# Altium footprint library PCB_CONNECTORS.PcbLib: 676 footprints (part 43 of 43) (continued)
## WEIDMULLER_1234600000 [mm] "Terminal Block, 24A 600V, Pitch 5.08mm, 8 Positions, Screw Connection" (continued)
  text "8" at 17.453,-3.2 h1
  text "7" at 12.373,-3.2 h1
  text "6" at 7.293,-3.2 h1
  text "5" at 2.213,-3.2 h1
  text "4" at -2.867,-3.2 h1
  text "3" at -7.947,-3.2 h1
  text "2" at -13.027,-3.2 h1
  text "1" at -18.032,-3.2 h1
3D body "WEIDMULLER_1234600000.stp": height 10, standoff -3.5, extent -20.995,-3.775 20.595,4.225

## WEIDMULLER_1760490000 [mm] "Terminal Block, 24A 600V, Pitch 5.08mm, 2 Positions, Screw Connection"
height 10
pads (2):
  round 2 hole 1.3: 1(-2.54,0) 2(2.54,0)
Top Overlay:
  circle w0.2: c2.54,0.577 r2
  circle w0.2: c-2.54,0.577 r2
  lines w0.2: -5.08,-3.25 -3.525,-3.25 ; -5.08,-2.25 -3.525,-2.25 ; -5.08,2.75 5.08,2.75 ; -5.08,2.95 -5.18,2.95 -5.38,2.75 -5.58,2.75 -5.58,3.75 -5.38,3.75 -5.18,3.55 -5.08,3.55 ; -4.19,1.52 -3.593,0.923 ; -3.483,2.227 -2.651,1.396 ; -1.617,-1.053 -1.597,-1.073 ; -1.35,-3.25 1.375,-3.25 ; -1.35,-2.25 1.375,-2.25 ; -1.144,-0.111 -0.89,-0.366 ; 0.89,1.52 1.487,0.923 ; 1.597,2.227 2.429,1.396 ; 3.463,-1.053 3.483,-1.073 ; 3.525,-3.25 5.08,-3.25 ; 3.525,-2.25 5.08,-2.25 ; 3.936,-0.111 4.19,-0.366 ; 5.08,-1.55 5.13,-1.55 5.33,-1.75 5.53,-1.75 5.53,-0.75 5.33,-0.75 5.13,-0.95 5.08,-0.95 ; -5.08,-3.75 5.08,-3.75 5.08,4.25 -5.08,4.25 -5.08,-3.75
  text "2" at 2.169,-3.2 h1
  text "1" at -2.792,-3.2 h1
Mechanical 8:
  lines w0.1: -3.04,0 -2.54,0 ; -2.54,-0.5 -2.54,0 ; -2.54,0.5 -2.54,0 ; -2.04,0 -2.54,0 ; -0.5,0 0,0 ; 0,-0.5 0,0 ; 0,0.5 0,0 ; 0.5,0 0,0 ; 2.04,0 2.54,0 ; 2.54,-0.5 2.54,0 ; 2.54,0.5 2.54,0 ; 3.04,0 2.54,0
Mechanical 14:
  circle w0.1: c2.54,0.577 r2
  circle w0.1: c2.54,0.577 r1.9
  circle w0.1: c-2.54,0.577 r2
  circle w0.1: c-2.54,0.577 r1.9
  lines w0.1: -5.08,-3.25 5.08,-3.25 ; -5.08,-2.25 5.08,-2.25 ; -5.08,2.75 5.08,2.75 ; -5.08,2.95 -5.18,2.95 -5.38,2.75 -5.58,2.75 -5.58,3.75 -5.38,3.75 -5.18,3.55 -5.08,3.55 ; -4.19,1.52 -1.597,-1.073 ; -3.483,2.227 -0.89,-0.366 ; 0.89,1.52 3.483,-1.073 ; 1.597,2.227 4.19,-0.366 ; 5.08,-1.55 5.13,-1.55 5.33,-1.75 5.53,-1.75 5.53,-0.75 5.33,-0.75 5.13,-0.95 5.08,-0.95 ; -5.08,-3.75 5.08,-3.75 5.08,4.25 -5.08,4.25 -5.08,-3.75
  text "1" at -2.792,-3.2 h1
  text "2" at 2.169,-3.2 h1
3D body "WEIDMULLER_1760490000.stp": height 10, standoff -3.5, extent -5.58,-3.75 5.53,4.25

## WEIDMULLER_1760500000 [mm] "Terminal Block, 24A 600V, Pitch 5.08mm, 3 Positions, Screw Connection"
height 10
pads (3):
  round 2 hole 1.3: 1(-5.08,0) 2(0,0) 3(5.08,0)
Top Overlay:
  circle w0.2: c-5.08,0.577 r2
  circle w0.2: c0,0.577 r2
  circle w0.2: c5.08,0.577 r2
  lines w0.2: -7.62,-3.25 -6.065,-3.25 ; -7.62,-2.25 -6.065,-2.25 ; -7.62,2.75 7.62,2.75 ; -7.62,2.95 -7.72,2.95 -7.92,2.75 -8.12,2.75 -8.12,3.75 -7.92,3.75 -7.72,3.55 -7.62,3.55 ; -6.73,1.52 -6.133,0.923 ; -6.023,2.227 -5.191,1.396 ; -4.157,-1.053 -4.137,-1.073 ; -3.89,-3.25 -1.165,-3.25 ; -3.89,-2.25 -1.165,-2.25 ; -3.684,-0.111 -3.43,-0.366 ; -1.65,1.52 -1.053,0.923 ; -0.943,2.227 -0.111,1.396 ; 0.923,-1.053 0.943,-1.073 ; 1.19,-3.25 3.915,-3.25 ; 1.19,-2.25 3.915,-2.25 ; 1.396,-0.111 1.65,-0.366 ; 3.43,1.52 4.027,0.923 ; 4.137,2.227 4.969,1.396 ; 6.003,-1.053 6.023,-1.073 ; 6.065,-3.25 7.62,-3.25 ; 6.065,-2.25 7.62,-2.25 ; 6.476,-0.111 6.73,-0.366 ; 7.62,-1.55 7.67,-1.55 7.87,-1.75 8.07,-1.75 8.07,-0.75 7.87,-0.75 7.67,-0.95 7.62,-0.95 ; -7.62,-3.75 7.62,-3.75 7.62,4.25 -7.62,4.25 -7.62,-3.75
  text "2" at -0.252,-3.2 h1
  text "1" at -5.332,-3.2 h1
  text "3" at 4.709,-3.2 h1
Mechanical 8:
  lines w0.1: -5.58,0 -5.08,0 ; -5.08,-0.5 -5.08,0 ; -5.08,0.5 -5.08,0 ; -4.58,0 -5.08,0 ; -0.5,0 0,0 ; 0,-0.5 0,0 ; 0,0.5 0,0 ; 0.5,0 0,0 ; 4.58,0 5.08,0 ; 5.08,-0.5 5.08,0 ; 5.08,0.5 5.08,0 ; 5.58,0 5.08,0
Mechanical 14:
  circle w0.1: c-5.08,0.577 r2
  circle w0.1: c-5.08,0.577 r1.9
  circle w0.1: c0,0.577 r2
  circle w0.1: c0,0.577 r1.9
  circle w0.1: c5.08,0.577 r2
  circle w0.1: c5.08,0.577 r1.9
  lines w0.1: -7.62,-3.25 7.62,-3.25 ; -7.62,-2.25 7.62,-2.25 ; -7.62,2.75 7.62,2.75 ; -7.62,2.95 -7.72,2.95 -7.92,2.75 -8.12,2.75 -8.12,3.75 -7.92,3.75 -7.72,3.55 -7.62,3.55 ; -6.73,1.52 -4.137,-1.073 ; -6.023,2.227 -3.43,-0.366 ; -1.65,1.52 0.943,-1.073 ; -0.943,2.227 1.65,-0.366 ; 3.43,1.52 6.023,-1.073 ; 4.137,2.227 6.73,-0.366 ; 7.62,-1.55 7.67,-1.55 7.87,-1.75 8.07,-1.75 8.07,-0.75 7.87,-0.75 7.67,-0.95 7.62,-0.95 ; -7.62,-3.75 7.62,-3.75 7.62,4.25 -7.62,4.25 -7.62,-3.75
  text "2" at -0.252,-3.2 h1
  text "1" at -5.332,-3.2 h1
  text "3" at 4.709,-3.2 h1
3D body "WEIDMULLER_1760500000.stp": height 10, standoff -3.5, extent -8.12,-3.75 8.07,4.25

## WEIDMULLER_1942150000 [mm] "10A 300 V, Pitch 3.81mm, 10 Positions PCB Right Angle Male Header, BC/SC 3.81 Serie"
height 7.1
pads (10):
  round 2 hole 1.3: 1(-17.145,0) 2(-13.335,0) 3(-9.525,0) 4(-5.715,0) 5(-1.905,0) 6(1.905,0) 7(5.715,0) 8(9.525,0) 9(13.335,0) 10(17.145,0)
Top Overlay:
  lines w0.2: -19.75,-7.395 -19.45,-7.395 ; -19.45,-7.995 -19.45,1.205 -17.754,1.205 ; -19.45,-5.495 -19.75,-5.495 -19.75,-7.995 19.74,-7.995 19.74,-5.495 19.44,-5.495 ; -16.536,1.205 -13.944,1.205 ; -12.726,1.205 -10.134,1.205 ; -8.916,1.205 -6.324,1.205 ; -5.106,1.205 -2.514,1.205 ; -1.296,1.205 1.296,1.205 ; 2.514,1.205 5.106,1.205 ; 6.324,1.205 8.916,1.205 ; 10.134,1.205 12.726,1.205 ; 13.944,1.205 16.536,1.205 ; 17.754,1.205 19.44,1.205 19.44,-7.995 ; 19.44,-7.395 19.74,-7.395
  text "10" at 16.405,-2.65 h1
  text "1" at -17.28,1.75 h1
Mechanical 8:
  lines w0.1: -17.645,0 -17.145,0 ; -17.145,-0.5 -17.145,0 ; -17.145,0.5 -17.145,0 ; -16.645,0 -17.145,0 ; -13.835,0 -13.335,0 ; -13.335,-0.5 -13.335,0 ; -13.335,0.5 -13.335,0 ; -12.835,0 -13.335,0 ; -10.025,0 -9.525,0 ; -9.525,-0.5 -9.525,0 ; -9.525,0.5 -9.525,0 ; -9.025,0 -9.525,0 ; -6.215,0 -5.715,0 ; -5.715,-0.5 -5.715,0 ; -5.715,0.5 -5.715,0 ; -5.215,0 -5.715,0 ; -2.405,0 -1.905,0 ; -1.905,-0.5 -1.905,0 ; -1.905,0.5 -1.905,0 ; -1.405,0 -1.905,0 ; -0.354,-0.354 0,0 ; -0.354,0.354 0,0 ; 0.354,-0.354 0,0 ; 0.354,0.354 0,0 ; 1.405,0 1.905,0 ; 1.905,-0.5 1.905,0 ; 1.905,0.5 1.905,0 ; 2.405,0 1.905,0 ; 5.215,0 5.715,0 ; 5.715,-0.5 5.715,0 ; 5.715,0.5 5.715,0 ; 6.215,0 5.715,0 ; 9.025,0 9.525,0 ; 9.525,-0.5 9.525,0 ; 9.525,0.5 9.525,0 ; 10.025,0 9.525,0 ; 12.835,0 13.335,0 ; 13.335,-0.5 13.335,0 ; 13.335,0.5 13.335,0 ; 13.835,0 13.335,0 ; 16.645,0 17.145,0 ; 17.145,-0.5 17.145,0 ; 17.145,0.5 17.145,0 ; 17.645,0 17.145,0
Mechanical 14:
  lines w0.1: -19.75,-7.395 -19.45,-7.395 ; -19.45,-7.995 -19.45,1.205 19.44,1.205 19.44,-7.995 ; -19.45,-5.495 -19.75,-5.495 -19.75,-7.995 19.74,-7.995 19.74,-5.495 19.44,-5.495 ; 19.44,-7.395 19.74,-7.395
  text "10" at 16.405,-2.65 h1
  text "9" at 12.995,-2.65 h1
  text "8" at 9.185,-2.65 h1
  text "7" at 5.375,-2.65 h1
  text "6" at 1.565,-2.65 h1
  text "5" at -2.245,-2.65 h1
  text "4" at -6.055,-2.65 h1
  text "3" at -9.865,-2.65 h1
  text "2" at -13.675,-2.65 h1
  text "1" at -17.485,-2.65 h1
3D body "WEIDMULLER_1942150000.stp": height 7.05, standoff -3.2, extent -19.75,-7.995 19.74,1.205

## WEIDMULLER_1942170000 [mm] "10A 300 V, Pitch 3.81mm, 12 Positions PCB Right Angle Male Header, BC/SC 3.81 Serie"
height 7.1
pads (12):
  round 2 hole 1.3: 1(-20.955,0) 2(-17.145,0) 3(-13.335,0) 4(-9.525,0) 5(-5.715,0) 6(-1.905,0) 7(1.905,0) 8(5.715,0) 9(9.525,0) 10(13.335,0) 11(17.145,0) 12(20.955,0)
Top Overlay:
  lines w0.2: -23.56,-7.395 -23.26,-7.395 ; -23.26,-7.995 -23.26,1.205 -21.564,1.205 ; -23.26,-5.495 -23.56,-5.495 -23.56,-7.995 23.55,-7.995 23.55,-5.495 23.25,-5.495 ; -20.346,1.205 -17.754,1.205 ; -16.536,1.205 -13.944,1.205 ; -12.726,1.205 -10.134,1.205 ; -8.916,1.205 -6.324,1.205 ; -5.106,1.205 -2.514,1.205 ; -1.296,1.205 1.296,1.205 ; 2.514,1.205 5.106,1.205 ; 6.324,1.205 8.916,1.205 ; 10.134,1.205 12.726,1.205 ; 13.944,1.205 16.536,1.205 ; 17.754,1.205 20.346,1.205 ; 21.564,1.205 23.25,1.205 23.25,-7.995 ; 23.25,-7.395 23.55,-7.395
  text "12" at 20.215,-2.65 h1
  text "1" at -21.09,1.75 h1
Mechanical 8:
  lines w0.1: -21.455,0 -20.955,0 ; -20.955,-0.5 -20.955,0 ; -20.955,0.5 -20.955,0 ; -20.455,0 -20.955,0 ; -17.645,0 -17.145,0 ; -17.145,-0.5 -17.145,0 ; -17.145,0.5 -17.145,0 ; -16.645,0 -17.145,0 ; -13.835,0 -13.335,0 ; -13.335,-0.5 -13.335,0 ; -13.335,0.5 -13.335,0 ; -12.835,0 -13.335,0 ; -10.025,0 -9.525,0 ; -9.525,-0.5 -9.525,0 ; -9.525,0.5 -9.525,0 ; -9.025,0 -9.525,0 ; -6.215,0 -5.715,0 ; -5.715,-0.5 -5.715,0 ; -5.715,0.5 -5.715,0 ; -5.215,0 -5.715,0 ; -2.405,0 -1.905,0 ; -1.905,-0.5 -1.905,0 ; -1.905,0.5 -1.905,0 ; -1.405,0 -1.905,0 ; -0.354,-0.354 0,0 ; -0.354,0.354 0,0 ; 0.354,-0.354 0,0 ; 0.354,0.354 0,0 ; 1.405,0 1.905,0 ; 1.905,-0.5 1.905,0 ; 1.905,0.5 1.905,0 ; 2.405,0 1.905,0 ; 5.215,0 5.715,0 ; 5.715,-0.5 5.715,0 ; 5.715,0.5 5.715,0 ; 6.215,0 5.715,0 ; 9.025,0 9.525,0 ; 9.525,-0.5 9.525,0 ; 9.525,0.5 9.525,0 ; 10.025,0 9.525,0 ; 12.835,0 13.335,0 ; 13.335,-0.5 13.335,0 ; 13.335,0.5 13.335,0 ; 13.835,0 13.335,0 ; 16.645,0 17.145,0 ; 17.145,-0.5 17.145,0 ; 17.145,0.5 17.145,0 ; 17.645,0 17.145,0 ; 20.455,0 20.955,0 ; 20.955,-0.5 20.955,0 ; 20.955,0.5 20.955,0 ; 21.455,0 20.955,0
Mechanical 14:
  lines w0.1: -23.56,-7.395 -23.26,-7.395 ; -23.26,-7.995 -23.26,1.205 23.25,1.205 23.25,-7.995 ; -23.26,-5.495 -23.56,-5.495 -23.56,-7.995 23.55,-7.995 23.55,-5.495 23.25,-5.495 ; 23.25,-7.395 23.55,-7.395
  text "12" at 20.215,-2.65 h1
  text "11" at 16.405,-2.65 h1
  text "1" at -21.295,-2.65 h1
  text "2" at -17.485,-2.65 h1
  text "3" at -13.675,-2.65 h1
  text "4" at -9.865,-2.65 h1
  text "5" at -6.055,-2.65 h1
  text "6" at -2.245,-2.65 h1
  text "7" at 1.565,-2.65 h1
  text "8" at 5.375,-2.65 h1
  text "9" at 9.185,-2.65 h1
  text "10" at 12.595,-2.65 h1
3D body "WEIDMULLER_1942170000.stp": height 7.05, standoff -3.2, extent -23.56,-7.995 23.55,1.205

## WEIDMULLER_1942940000 [mm] "24A 400 V, Pitch 3.81mm, 12 Positions PCB Male Header, Type SC 3.81 Serie"
height 9.2
pads (12):
  round 2 hole 1.3: 1(-20.955,0) 2(-17.145,0) 3(-13.335,0) 4(-9.525,0) 5(-5.715,0) 6(-1.905,0) 7(1.905,0) 8(5.715,0) 9(9.525,0) 10(13.335,0) 11(17.145,0) 12(20.955,0)
Top Overlay:
  drawing of 194 lines, arcs and shapes, not listed
  text "12" at 21.475,1.615 h1
  text "1" at -21.19,4.6 h1
Mechanical 8:
  lines w0.1: -21.455,0 -20.955,0 ; -20.955,-0.5 -20.955,0 ; -20.955,0.5 -20.955,0 ; -20.455,0 -20.955,0 ; -17.645,0 -17.145,0 ; -17.145,-0.5 -17.145,0 ; -17.145,0.5 -17.145,0 ; -16.645,0 -17.145,0 ; -13.835,0 -13.335,0 ; -13.335,-0.5 -13.335,0 ; -13.335,0.5 -13.335,0 ; -12.835,0 -13.335,0 ; -10.025,0 -9.525,0 ; -9.525,-0.5 -9.525,0 ; -9.525,0.5 -9.525,0 ; -9.025,0 -9.525,0 ; -6.215,0 -5.715,0 ; -5.715,-0.5 -5.715,0 ; -5.715,0.5 -5.715,0 ; -5.215,0 -5.715,0 ; -2.405,0 -1.905,0 ; -1.905,-0.5 -1.905,0 ; -1.905,0.5 -1.905,0 ; -1.405,0 -1.905,0 ; -0.5,0 0,0 ; 0,-0.5 0,0 ; 0,0.5 0,0 ; 0.5,0 0,0 ; 1.405,0 1.905,0 ; 1.905,-0.5 1.905,0 ; 1.905,0.5 1.905,0 ; 2.405,0 1.905,0 ; 5.215,0 5.715,0 ; 5.715,-0.5 5.715,0 ; 5.715,0.5 5.715,0 ; 6.215,0 5.715,0 ; 9.025,0 9.525,0 ; 9.525,-0.5 9.525,0 ; 9.525,0.5 9.525,0 ; 10.025,0 9.525,0 ; 12.835,0 13.335,0 ; 13.335,-0.5 13.335,0 ; 13.335,0.5 13.335,0 ; 13.835,0 13.335,0 ; 16.645,0 17.145,0 ; 17.145,-0.5 17.145,0 ; 17.145,0.5 17.145,0 ; 17.645,0 17.145,0 ; 20.455,0 20.955,0 ; 20.955,-0.5 20.955,0 ; 20.955,0.5 20.955,0 ; 21.455,0 20.955,0
Mechanical 14:
  drawing of 194 lines, arcs and shapes, not listed
  text "10" at 12.595,1.4 h1
  text "9" at 9.185,1.4 h1
  text "11" at 16.405,1.4 h1
  text "12" at 21.475,1.615 h1
  text "8" at 5.375,1.4 h1
  text "7" at 1.565,1.4 h1
  text "3" at -13.675,1.4 h1
  text "2" at -17.485,1.4 h1
  text "1" at -21.09,1.4 h1
  text "4" at -9.865,1.4 h1
  text "5" at -6.055,1.4 h1
  text "6" at -2.245,1.4 h1
3D body "WEIDMULLER_1942940000.stp": height 9.2, standoff -3.2, extent -23.555,-3 23.555,4.05

## WF-02R [mm] "2.54mm (.100\") Pitch KK® Wire-To-Board Header, Right Angle, With Friction Lock, 2 Circuits"
height 5.8
pads (2):
  round 1.9 hole 1.2: 1(-1.27,0.002) 2(1.27,-0.002)
Top Overlay:
  lines w0.2: -1.587,1.209 -1.587,3.355 ; -1.587,5.895 -1.587,12.368 ; -1.27,5.895 -1.27,14.42 1.27,14.42 1.27,5.895 ; -1.27,12.368 -1.587,12.368 ; -1.27,12.495 -1.46,12.495 -1.587,12.368 ; -0.953,1.209 -0.953,3.355 ; 0.953,1.209 0.953,3.355 ; 1.27,12.368 1.587,12.368 ; 1.27,12.495 1.46,12.495 1.587,12.368 ; 1.587,1.209 1.587,3.355 ; 1.587,5.895 1.587,12.368 ; -2.54,2.72 -2.54,5.895 2.54,5.895 2.54,2.72 2.095,2.72 2.095,3.355 0.445,3.355 0.445,2.72 -0.445,2.72 -0.445,3.355 -2.095,3.355 -2.095,2.72 -2.54,2.72
  text "1" at -2.442,1.27 h1
Mechanical 8:
  lines w0.1: -1.77,0 -1.27,0 ; -1.27,-0.5 -1.27,0 ; -1.27,0.5 -1.27,0 ; -0.77,0 -1.27,0 ; -0.5,0 0,0 ; 0,-0.5 0,0 ; 0,0.5 0,0 ; 0.5,0 0,0 ; 0.77,0 1.27,0 ; 1.27,-0.5 1.27,0 ; 1.27,0.5 1.27,0 ; 1.77,0 1.27,0
Mechanical 14:
  lines w0.1: -1.587,3.355 -1.587,-0.318 -0.953,-0.318 -0.953,3.355 ; -1.587,5.895 -1.587,12.368 ; -1.27,5.895 -1.27,14.42 1.27,14.42 1.27,5.895 ; -1.27,12.368 -1.587,12.368 ; -1.27,12.495 -1.46,12.495 -1.587,12.368 ; 0.953,3.355 0.953,-0.318 1.587,-0.318 1.587,3.355 ; 1.27,12.368 1.587,12.368 ; 1.27,12.495 1.46,12.495 1.587,12.368 ; 1.587,5.895 1.587,12.368 ; -2.54,2.72 -2.54,5.895 2.54,5.895 2.54,2.72 2.095,2.72 2.095,3.355 0.445,3.355 0.445,2.72 -0.445,2.72 -0.445,3.355 -2.095,3.355 -2.095,2.72 -2.54,2.72
  text "1" at -2.442,1.27 h1
3D body "MOLEX_22-05-7028.stp": height 5.84, standoff -3.8, extent -2.54,-0.317 2.54,14.42

## WF-03 [mm] "2.54mm (.100\") Pitch KK® Header, Single Row, Vertical, 3 Circuits"
height 11.7
pads (3):
  round 1.9 hole 1.2: 1(-2.54,0.005) 2(0,0) 3(2.54,0)
Top Overlay:
  lines w0.2: -2.54,-2.873 -2.54,-1.342 2.54,-1.342 2.54,-2.873 ; -2.54,-1.873 2.54,-1.873 ; -2.267,-2.873 -2.267,-1.873 ; 2.267,-2.873 2.267,-1.873 ; -3.81,-2.873 -3.81,2.928 3.81,2.928 3.81,-2.873 -3.81,-2.873
  text "1" at -2.75,1.4 h1
Mechanical 8:
  lines w0.1: -3.54,0.005 -2.54,0.005 ; -2.54,-0.995 -2.54,0.005 ; -2.54,1.005 -2.54,0.005 ; -1.54,0.005 -2.54,0.005 ; -1,0 0,0 ; 0,-1 0,0 ; 0,1 0,0 ; 1,0 0,0 ; 1.54,0 2.54,0 ; 2.54,-1 2.54,0 ; 2.54,1 2.54,0 ; 3.54,0 2.54,0
Mechanical 14:
  lines w0.1: -2.86,-0.312 -2.22,-0.312 -2.22,0.327 -2.86,0.327 -2.86,-0.308 ; -2.54,-2.873 -2.54,-1.342 2.54,-1.342 2.54,-2.873 ; -2.54,-1.873 2.54,-1.873 ; -2.267,-2.873 -2.267,-1.873 ; -0.32,-0.318 0.32,-0.318 0.32,0.323 -0.32,0.323 -0.32,-0.312 ; 2.22,-0.318 2.86,-0.318 2.86,0.323 2.22,0.323 2.22,-0.312 ; 2.267,-2.873 2.267,-1.873 ; -3.81,-2.873 -3.81,2.928 3.81,2.928 3.81,-2.873 -3.81,-2.873
  text "1" at -2.75,1.4 h1
3D body "MOLEX_22-27-2031.stp": height 11.7, standoff -3.56, extent -3.81,-2.873 3.81,2.927

## WF-04 [mm] "2.54mm (.100\") Pitch KK® Header, Single Row, Vertical, 4 Circuits"
height 11.7
pads (4):
  round 1.9 hole 1.2: 1(-3.81,0) 2(-1.27,0) 3(1.27,0) 4(3.81,0)
Top Overlay:
  lines w0.2: -3.81,-2.883 -3.81,-1.353 3.81,-1.353 3.81,-2.883 ; -3.81,-1.883 3.81,-1.883 ; -3.537,-2.883 -3.537,-1.883 ; 3.537,-2.883 3.537,-1.883 ; -5.08,-2.883 -5.08,2.918 5.08,2.918 5.08,-2.883 -5.08,-2.883
  text "1" at -4.02,1.395 h1
Mechanical 14:
  lines w0.1: -3.81,-2.883 -3.81,-1.353 3.81,-1.353 3.81,-2.883 ; -3.81,-1.883 3.81,-1.883 ; -3.537,-2.883 -3.537,-1.883 ; 3.537,-2.883 3.537,-1.883 ; -5.08,-2.883 -5.08,2.918 5.08,2.918 5.08,-2.883 -5.08,-2.883 ; -4.13,-0.318 -3.49,-0.318 -3.49,0.318 -4.13,0.318 -4.13,-0.318 ; -1.59,-0.318 -0.95,-0.318 -0.95,0.318 -1.59,0.318 -1.59,-0.318 ; 0.95,-0.318 1.59,-0.318 1.59,0.318 0.95,0.318 0.95,-0.318 ; 3.49,-0.318 4.13,-0.318 4.13,0.318 3.49,0.318 3.49,-0.318
  text "1" at -4.02,1.395 h1
Mechanical 15:
  lines w0.1: -4.318,0 -3.302,0 ; -3.81,-0.508 -3.81,0 -3.81,0.508 ; -1.778,0 -0.762,0 ; -1.27,-0.508 -1.27,0 -1.27,0.508 ; -0.508,0 0.508,0 ; 0,-0.508 0,0 0,0.508 ; 0.762,0 1.778,0 ; 1.27,-0.508 1.27,0 1.27,0.508 ; 3.302,0 4.318,0 ; 3.81,-0.508 3.81,0 3.81,0.508 ; -5.1,-2.9 -5.1,2.9 5.1,2.9 5.1,-2.9 -5.1,-2.9
3D body "MOLEX_22-27-2041.stp": height 11.7, standoff -3.56, extent -5.08,-2.883 5.08,2.917

## WF-04R [mm]
pads (4):
  round 1.9 hole 1.2: 1(-3.81,-6.985) 2(-1.27,-6.985) 3(1.27,-6.985) 4(3.81,-6.985)
Mechanical 14:
  lines w0.1: -4.13,-6.485 ccw(c-3.81,-6.985) -3.49,-6.485 ; -4.13,-5.985 ccw(c-3.81,-6.985) -3.49,-5.985 ; -4.13,-1.585 -4.13,6.515 ; -4.11,6.535 -3.505,6.535 ; -3.49,-1.585 -3.49,6.52 -3.701,6.731 ; -3.49,0.515 -1.59,0.515 ; -3.49,1.015 -1.615,1.015 ; -3.49,3.015 -1.59,3.015 ; -3.49,3.515 -1.615,3.515 ; -3.485,6.515 -3.71,6.74 -3.905,6.74 -4.13,6.515 ; -1.59,-6.485 ccw(c-1.27,-6.985) -0.95,-6.485 ; -1.59,-5.985 ccw(c-1.27,-6.985) -0.95,-5.985 ; -1.59,-1.585 -1.59,6.515 ; -1.57,6.535 -0.965,6.535 ; -0.95,-1.585 -0.95,6.52 -1.161,6.731 -1.374,6.731 -1.59,6.515 ; -0.95,0.515 0.95,0.515 ; -0.95,1.015 0.925,1.015 ; -0.95,3.015 0.95,3.015 ; -0.95,3.515 0.925,3.515 ; -0.945,6.515 -1.17,6.74 -1.365,6.74 -1.59,6.515 ; 0.95,-6.485 ccw(c1.27,-6.985) 1.59,-6.485 ; 0.95,-5.985 ccw(c1.27,-6.985) 1.59,-5.985 ; 0.95,-1.585 0.95,6.515 ; 0.97,6.535 1.575,6.535 ; 1.59,-1.585 1.59,6.52 1.379,6.731 1.166,6.731 0.95,6.515 ; 1.59,0.515 3.49,0.515 ; 1.59,1.015 3.465,1.015 ; 1.59,3.015 3.49,3.015 ; 1.59,3.515 3.465,3.515 ; 1.595,6.515 1.37,6.74 1.175,6.74 0.95,6.515 ; 3.49,-6.485 ccw(c3.81,-6.985) 4.13,-6.485 ; 3.49,-5.985 ccw(c3.81,-6.985) 4.13,-5.985 ; 3.49,-1.585 3.49,6.515 ; 3.51,6.535 4.115,6.535 ; 4.13,-1.585 4.13,6.52 3.919,6.731 3.706,6.731 ; 4.135,6.515 3.91,6.74 3.715,6.74 3.49,6.515 ; -4.13,-3.485 -4.13,-7.302 -3.49,-7.302 -3.49,-3.485 ; -4.13,-3.485 -3.49,-3.485 ; -4.13,-3.485 -4.445,-3.485 -4.445,-4.485 -5.08,-4.485 -5.08,-1.585 -3.51,-1.585 5.08,-1.585 5.08,-4.485 4.445,-4.485 4.445,-3.485 4.13,-3.485 ; -4.13,6.515 -3.914,6.731 -3.701,6.731 ; -3.701,6.731 3.706,6.731 ; -3.49,-3.485 -3.175,-3.485 -3.175,-4.485 -1.905,-4.485 -1.905,-3.485 -1.59,-3.485 ; -1.59,-3.485 -0.95,-3.485 ; -1.59,-3.485 -1.59,-7.302 -0.95,-7.302 -0.95,-3.485 ; -1.59,-3.485 -0.95,-3.485 ; -0.95,-3.485 -0.635,-3.485 -0.635,-4.485 0.635,-4.485 0.635,-3.485 0.95,-3.485 ; 0.95,-3.485 1.59,-3.485 ; 0.95,-3.485 0.95,-7.302 1.59,-7.302 1.59,-3.485 ; 0.95,-3.485 1.59,-3.485 ; 1.59,-3.485 1.905,-3.485 1.905,-4.485 3.175,-4.485 3.175,-3.485 3.49,-3.485 ; 3.49,-3.485 4.13,-3.485 ; 3.49,-3.485 3.49,-7.302 4.13,-7.302 4.13,-3.485 ; 3.49,-3.485 4.13,-3.485 ; 3.49,6.515 3.706,6.731
  text ".Designator" at -4.26,6.94 h2
  text ".Comment" at -2.685,-3.16 h1.5
Mechanical 15:
  lines w0.1: -5.1,-8.1 5.1,-8.1 5.1,6.8 -5.1,6.8 -5.1,-8.1
  lines w0.2: -0.5,0 0.5,0 ; 0,-0.5 0,0.5
3D body "User Library-DS1070-4MR (WF-4RA CONNFLY).step": height 5.9, standoff -3.4, extent -5.08,-7.305 5.08,6.795

## WURTH_651005136521 [mm] "Mini USB Type B Horizontal 5 Contacts"
height 3.9
pads (9):
  round 1.2 hole 0.6: 1(-1.6,0) 2(-0.8,-1.2) 3(0,0) 4(0.8,-1.2) 5(1.6,0)
  oval 1.6x2.3 hole 0.9 slot 1.6 at 90 deg: 6(-3.65,-5.55) 6(-3.65,-0.9) 6(3.65,-5.55) 6(3.65,-0.9)
Top Overlay:
  lines w0.2: -3.85,-6.982 -3.85,-8.7 3.85,-8.7 3.85,-6.982 ; -3.85,-4.118 -3.85,-2.332 ; -3.35,-8.7 -3.35,-6.958 ; -3.35,-4.142 -3.35,-2.308 ; -2.875,-6.681 -2.875,-7.65 ccw(c-2.775,-7.65) -2.775,-7.75 -1.725,-7.75 ccw(c-1.725,-7.65) -1.625,-7.65 -1.625,-4.4 ccw(c-1.725,-4.4) -1.725,-4.3 -2.775,-4.3 ccw(c-2.775,-4.4) -2.875,-4.4 -2.875,-4.419 ; -2.694,-4.3 cw(c-2.694,-4.396) -2.597,-4.396 -2.509,-6.881 ccw(c-2.25,-6.881) -1.991,-6.881 -1.904,-4.396 ; -2.513,-6.771 ccw(c-2.25,-6.769) -1.987,-6.769 ; -2.036,-0.9 -2.15,-0.9 ccw(c-2.15,-1) -2.25,-1 -2.25,-1.4 ccw(c-2.15,-1.4) -2.15,-1.5 -1.754,-1.5 ; -1.904,-4.403 cw(c-1.801,-4.403) -1.801,-4.3 ; -1.1,-2.154 -1.1,-2.6 ccw(c-1,-2.6) -1,-2.7 1,-2.7 ccw(c1,-2.6) 1.1,-2.6 1.1,-2.154 ; -0.661,-4.328 cw(c-0.425,-4.336) -0.425,-4.1 0.425,-4.1 cw(c0.425,-4.336) 0.661,-4.328 ; -0.45,-2.137 -0.45,-2.15 ccw(c-0.35,-2.15) -0.35,-2.25 0.35,-2.25 ccw(c0.35,-2.15) 0.45,-2.15 0.45,-2.137 ; 1.754,-1.5 2.15,-1.5 ccw(c2.15,-1.4) 2.25,-1.4 2.25,-1 ccw(c2.15,-1) 2.15,-0.9 2.036,-0.9 ; 1.802,-4.3 cw(c1.802,-4.396) 1.898,-4.396 1.987,-6.881 ccw(c2.246,-6.881) 2.504,-6.881 2.592,-4.396 ; 1.983,-6.771 ccw(c2.246,-6.769) 2.508,-6.769 ; 2.591,-4.403 cw(c2.695,-4.403) 2.695,-4.3 ; 2.871,-6.676 2.871,-7.65 cw(c2.771,-7.65) 2.771,-7.75 1.721,-7.75 cw(c1.721,-7.65) 1.621,-7.65 1.621,-4.4 cw(c1.721,-4.4) 1.721,-4.3 2.771,-4.3 cw(c2.771,-4.4) 2.871,-4.4 2.871,-4.424 ; 3.35,-8.7 3.35,-6.958 ; 3.35,-4.142 3.35,-2.308 ; 3.85,-4.118 3.85,-2.332 ; -1.147,-7.653 ccw(c-1.047,-7.657) -1.047,-7.757 -0.872,-7.757 ccw(c-0.872,-7.657) -0.772,-7.66 -0.654,-4.129 cw(c-0.418,-4.137) -0.418,-3.901 0.418,-3.901 cw(c0.418,-4.137) 0.654,-4.129 0.772,-7.653 ccw(c0.872,-7.65) 0.872,-7.75 1.047,-7.75 ccw(c1.047,-7.65) 1.147,-7.647 0.999,-3.347 ccw(c0.9,-3.35) 0.9,-3.25 -0.9,-3.25 ccw(c-0.9,-3.35) -0.999,-3.347 -1.147,-7.653
Mechanical 8:
  lines w0.1: -3.9,-5.9 -3.65,-5.9 ; -3.9,-5.55 -3.65,-5.55 ; -3.9,-5.2 -3.65,-5.2 ; -3.9,-1.25 -3.65,-1.25 ; -3.9,-0.9 -3.65,-0.9 ; -3.9,-0.55 -3.65,-0.55 ; -3.65,-6.15 -3.65,-5.9 ; -3.65,-5.8 -3.65,-5.55 ; -3.65,-5.3 -3.65,-5.55 ; -3.65,-4.95 -3.65,-5.2 ; -3.65,-1.5 -3.65,-1.25 ; -3.65,-1.15 -3.65,-0.9 ; -3.65,-0.65 -3.65,-0.9 ; -3.65,-0.3 -3.65,-0.55 ; -3.4,-5.9 -3.65,-5.9 ; -3.4,-5.55 -3.65,-5.55 ; -3.4,-5.2 -3.65,-5.2 ; -3.4,-1.25 -3.65,-1.25 ; -3.4,-0.9 -3.65,-0.9 ; -3.4,-0.55 -3.65,-0.55 ; -2.1,0 -1.6,0 ; -1.6,-0.5 -1.6,0 ; -1.6,0.5 -1.6,0 ; -1.3,-1.2 -0.8,-1.2 ; -1.1,0 -1.6,0 ; -0.8,-1.7 -0.8,-1.2 ; -0.8,-0.7 -0.8,-1.2 ; -0.5,-4.5 0,-4.5 ; -0.5,0 0,0 ; -0.3,-1.2 -0.8,-1.2 ; 0,-5 0,-4.5 ; 0,-4 0,-4.5 ; 0,-0.5 0,0 ; 0,0.5 0,0 ; 0.3,-1.2 0.8,-1.2 ; 0.5,-4.5 0,-4.5 ; 0.5,0 0,0 ; 0.8,-1.7 0.8,-1.2 ; 0.8,-0.7 0.8,-1.2 ; 1.1,0 1.6,0 ; 1.3,-1.2 0.8,-1.2 ; 1.6,-0.5 1.6,0 ; 1.6,0.5 1.6,0 ; 2.1,0 1.6,0 ; 3.4,-5.9 3.65,-5.9 ; 3.4,-5.55 3.65,-5.55 ; 3.4,-5.2 3.65,-5.2 ; 3.4,-1.25 3.65,-1.25 ; 3.4,-0.9 3.65,-0.9 ; 3.4,-0.55 3.65,-0.55 ; 3.65,-6.15 3.65,-5.9 ; 3.65,-5.8 3.65,-5.55 ; 3.65,-5.3 3.65,-5.55 ; 3.65,-4.95 3.65,-5.2 ; 3.65,-1.5 3.65,-1.25 ; 3.65,-1.15 3.65,-0.9 ; 3.65,-0.65 3.65,-0.9 ; 3.65,-0.3 3.65,-0.55 ; 3.9,-5.9 3.65,-5.9 ; 3.9,-5.55 3.65,-5.55 ; 3.9,-5.2 3.65,-5.2 ; 3.9,-1.25 3.65,-1.25 ; 3.9,-0.9 3.65,-0.9 ; 3.9,-0.55 3.65,-0.55 ; -4.1,-5.9 ccw(c-3.65,-5.9) -3.2,-5.9 -3.2,-5.2 ccw(c-3.65,-5.2) -4.1,-5.2 -4.1,-5.9 ; -4.1,-1.25 ccw(c-3.65,-1.25) -3.2,-1.25 -3.2,-0.55 ccw(c-3.65,-0.55) -4.1,-0.55 -4.1,-1.25 ; 3.2,-5.9 ccw(c3.65,-5.9) 4.1,-5.9 4.1,-5.2 ccw(c3.65,-5.2) 3.2,-5.2 3.2,-5.9 ; 3.2,-1.25 ccw(c3.65,-1.25) 4.1,-1.25 4.1,-0.55 ccw(c3.65,-0.55) 3.2,-0.55 3.2,-1.25
Mechanical 14:
  lines w0.1: -3.85,-5.955 cw(c-3.675,-5.595) -4.075,-5.595 -4.075,-5.505 cw(c-3.675,-5.505) -3.85,-5.145 ; -3.85,-1.305 cw(c-3.675,-0.945) -4.075,-0.945 -4.075,-0.855 cw(c-3.675,-0.855) -3.85,-0.495 ; -3.35,-8.7 -3.35,-0.3 ; -2.694,-4.3 cw(c-2.694,-4.396) -2.597,-4.396 -2.509,-6.881 ccw(c-2.25,-6.881) -1.991,-6.881 -1.904,-4.396 ; -2.513,-6.771 ccw(c-2.25,-6.769) -1.987,-6.769 ; -1.904,-4.403 cw(c-1.801,-4.403) -1.801,-4.3 ; -1.8,-0.3 -1.8,0.125 -1.4,0.125 -1.4,-0.3 ; -0.661,-4.328 cw(c-0.425,-4.336) -0.425,-4.1 0.425,-4.1 cw(c0.425,-4.336) 0.661,-4.328 ; -0.55,-0.9 cw(c-0.55,-1) -0.45,-1 -0.45,-2.15 ccw(c-0.35,-2.15) -0.35,-2.25 0.35,-2.25 ccw(c0.35,-2.15) 0.45,-2.15 0.45,-1 cw(c0.55,-1) 0.55,-0.9 ; -0.2,-0.3 -0.2,0.125 0.2,0.125 0.2,-0.3 ; 1.4,-0.3 1.4,0.125 1.8,0.125 1.8,-0.3 ; 1.802,-4.3 cw(c1.802,-4.396) 1.898,-4.396 1.987,-6.881 ccw(c2.246,-6.881) 2.504,-6.881 2.592,-4.396 ; 1.983,-6.771 ccw(c2.246,-6.769) 2.508,-6.769 ; 2.591,-4.403 cw(c2.695,-4.403) 2.695,-4.3 ; 3.35,-8.7 3.35,-0.3 ; 3.85,-5.955 ccw(c3.675,-5.595) 4.075,-5.595 4.075,-5.505 ccw(c3.675,-5.505) 3.85,-5.145 ; 3.85,-1.305 ccw(c3.675,-0.945) 4.075,-0.945 4.075,-0.855 ccw(c3.675,-0.855) 3.85,-0.495 ; -3.85,-8.7 3.85,-8.7 3.85,-0.3 -3.85,-0.3 -3.85,-8.7 ; -2.875,-7.65 ccw(c-2.775,-7.65) -2.775,-7.75 -1.725,-7.75 ccw(c-1.725,-7.65) -1.625,-7.65 -1.625,-4.4 ccw(c-1.725,-4.4) -1.725,-4.3 -2.775,-4.3 ccw(c-2.775,-4.4) -2.875,-4.4 -2.875,-7.65 ; -2.25,-1.4 ccw(c-2.15,-1.4) -2.15,-1.5 -1.2,-1.5 cw(c-1.2,-1.6) -1.1,-1.6 -1.1,-2.6 ccw(c-1,-2.6) -1,-2.7 1,-2.7 ccw(c1,-2.6) 1.1,-2.6 1.1,-1.6 cw(c1.2,-1.6) 1.2,-1.5 2.15,-1.5 ccw(c2.15,-1.4) 2.25,-1.4 2.25,-1 ccw(c2.15,-1) 2.15,-0.9 -2.15,-0.9 ccw(c-2.15,-1) -2.25,-1 -2.25,-1.4 ; -1.147,-7.653 ccw(c-1.047,-7.657) -1.047,-7.757 -0.872,-7.757 ccw(c-0.872,-7.657) -0.772,-7.66 -0.654,-4.129 cw(c-0.418,-4.137) -0.418,-3.901 0.418,-3.901 cw(c0.418,-4.137) 0.654,-4.129 0.772,-7.653 ccw(c0.872,-7.65) 0.872,-7.75 1.047,-7.75 ccw(c1.047,-7.65) 1.147,-7.647 0.999,-3.347 ccw(c0.9,-3.35) 0.9,-3.25 -0.9,-3.25 ccw(c-0.9,-3.35) -0.999,-3.347 -1.147,-7.653 ; 1.621,-7.65 ccw(c1.721,-7.65) 1.721,-7.75 2.771,-7.75 ccw(c2.771,-7.65) 2.871,-7.65 2.871,-4.4 ccw(c2.771,-4.4) 2.771,-4.3 1.721,-4.3 ccw(c1.721,-4.4) 1.621,-4.4 1.621,-7.65
3D body "WURTH_651005136521.stp": height 3.9, standoff -2.6, extent -4.075,-8.7 4.075,0.125